# Altium footprint library IFAT6.PcbLib: 65 footprints (part 2 of 5)
Each footprint in its own frame and in the unit in brackets; x right, y up, seen from the top. Pads: shape width x height; smd on the part's side, far side on the other; paste and mask are expansions set on the pad; w line width, h text height; cw(c..) or ccw(c..) is an arc to the next point about the centre after c.
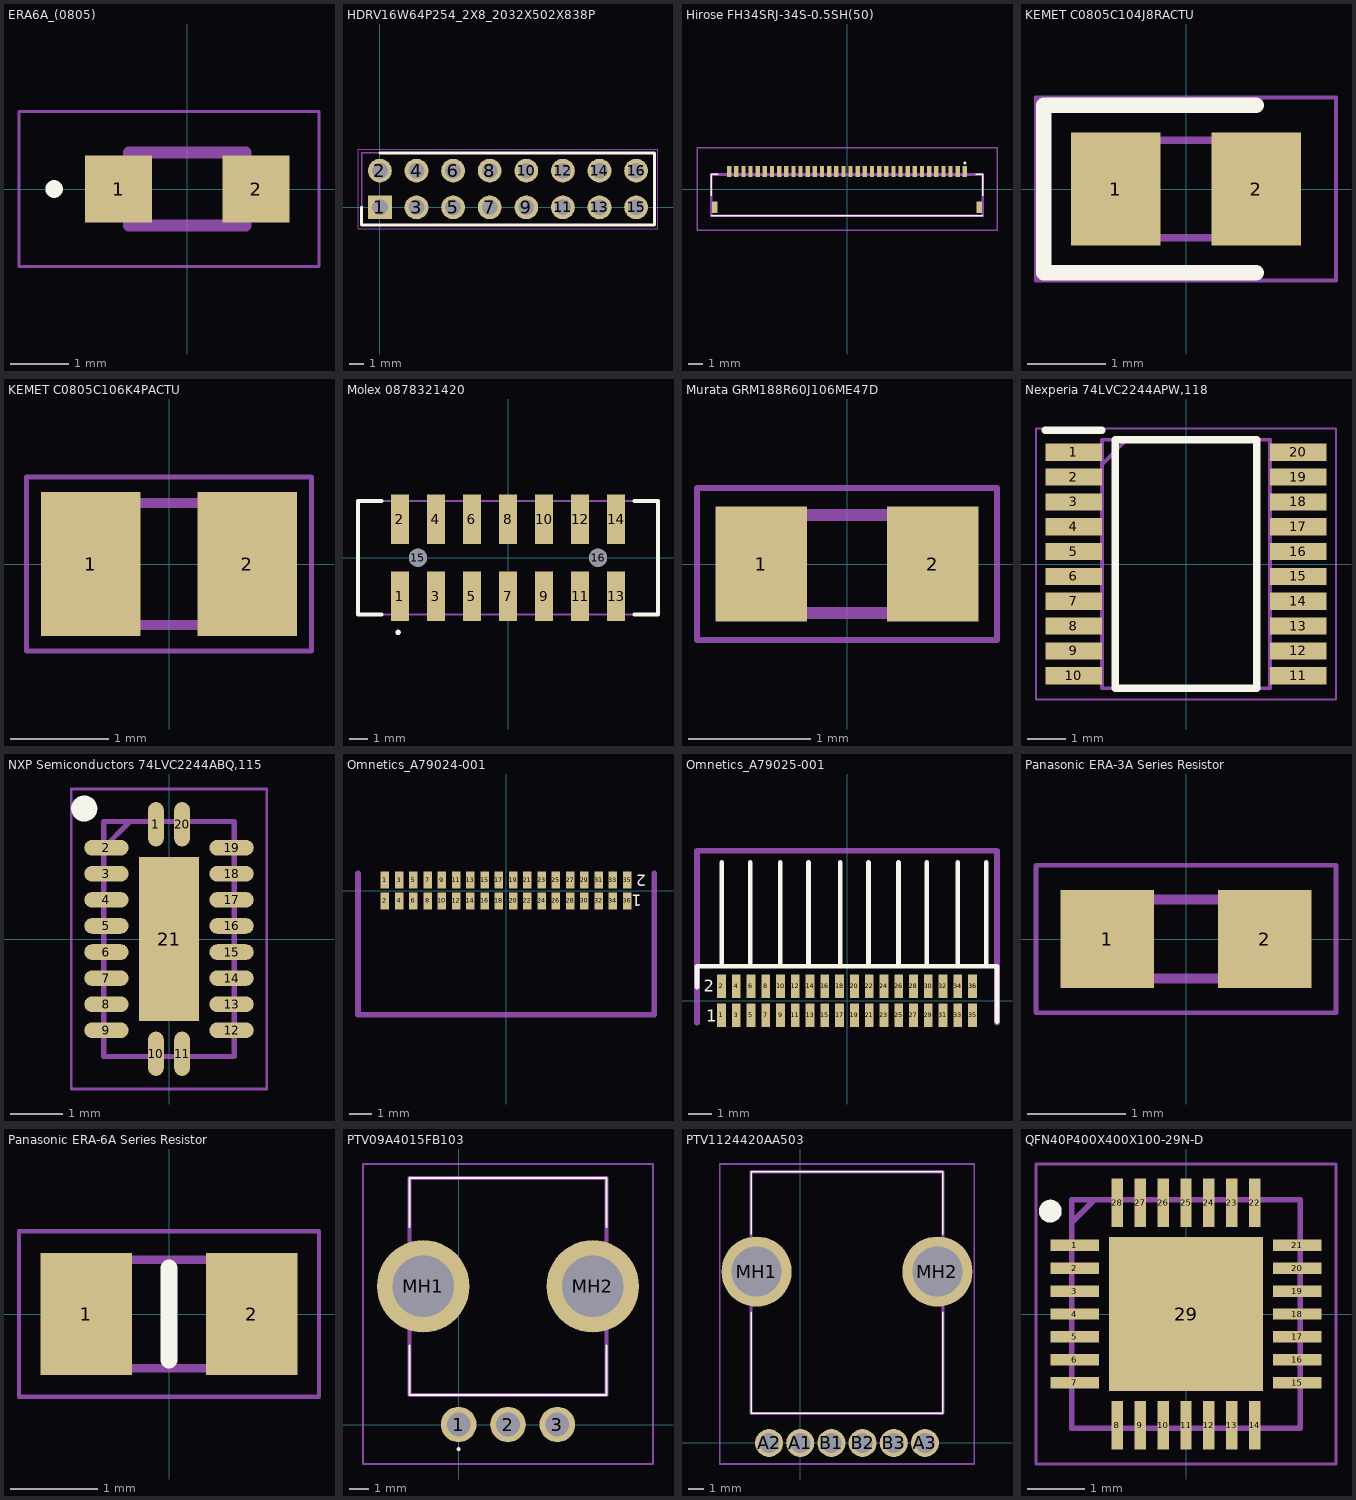
[diagram p1: the footprints below, top view; thin cyan lines are the x and y axes]

## ERA6A_(0805) [mm]
pads (2):
  rect 1.15x1.15 smd: 1(-1.175,0) 2(1.175,0)
Top Overlay:
  circle w0.2: c-2.275,0 r0.05
Mechanical 13:
  lines w0.2: -1,-0.625 -1,0.625 1,0.625 1,-0.625 -1,-0.625
Mechanical 15:
  lines w0.05: -2.875,-1.325 -2.875,1.325 2.25,1.325 2.25,-1.325 -2.875,-1.325
3D body "ERA-6AEB2741V.stp": height 0.5, standoff 0, extent -1,-0.625 1,0.625

## HDRV16W64P254_2X8_2032X502X838P [mm]
pads (16):
  rect 1.65x1.65 hole 1.1: 1(0,0)
  round 1.65 hole 1.1: 2(0,2.54) 3(2.54,0) 4(2.54,2.54) 5(5.08,0) 6(5.08,2.54) 7(7.62,0) 8(7.62,2.54) 9(10.16,0) 10(10.16,2.54) 11(12.7,0) 12(12.7,2.54) 13(15.24,0) 14(15.24,2.54) 15(17.78,0) 16(17.78,2.54)
Top Overlay:
  lines w0.2: -1.27,0 -1.27,-1.24 19.05,-1.24 19.05,3.78 0,3.78
Mechanical 13:
  lines w0.1: -1.27,-1.24 19.05,-1.24 19.05,3.78 -1.27,3.78 -1.27,-1.24
Mechanical 15:
  lines w0.05: -1.52,-1.49 19.3,-1.49 19.3,4.03 -1.52,4.03 -1.52,-1.49
3D body "HTSW-108-07-G-D.stp": height 8.38, standoff -2.54, extent -1.27,-1.24 19.05,3.78

## Hirose FH34SRJ-34S-0.5SH(50) [mm] "CONN FPC/FFC 34POS .5MM"
pads (36):
  rect 0.3x0.8 smd: 1(8.25,1.225) 2(7.75,1.225) 3(7.25,1.225) 4(6.75,1.225) 5(6.25,1.225) 6(5.75,1.225) 7(5.25,1.225) 8(4.75,1.225) 9(4.25,1.225) 10(3.75,1.225) 11(3.25,1.225) 12(2.75,1.225) 13(2.25,1.225) 14(1.75,1.225) 15(1.25,1.225) 16(0.75,1.225) 17(0.25,1.225) 18(-0.25,1.225) 19(-0.75,1.225) 20(-1.25,1.225) 21(-1.75,1.225) 22(-2.25,1.225) 23(-2.75,1.225) 24(-3.25,1.225) 25(-3.75,1.225) 26(-4.25,1.225) 27(-4.75,1.225) 28(-5.25,1.225) 29(-5.75,1.225) 30(-6.25,1.225) 31(-6.75,1.225) 32(-7.25,1.225) 33(-7.75,1.225) 34(-8.25,1.225)
  rect 0.4x0.8 smd: MP1(-9.25,-1.275) MP2(9.25,-1.275)
Top Overlay:
  lines w0.1: -9.5,-1.875 9.5,-1.875 ; -9.5,-0.475 -9.5,1.025 -9,1.025 ; 9,1.025 9.5,1.025 9.5,-0.475 ; 8.2,1.825 ccw(c8.25,1.825) 8.3,1.825 ccw(c8.25,1.825) 8.2,1.825
Mechanical 13:
  lines w0.2: -9.5,-1.875 -9.5,1.025 9.5,1.025 9.5,-1.875 -9.5,-1.875
Mechanical 15:
  lines w0.1: -10.5,-2.875 -10.5,2.875 10.5,2.875 10.5,-2.875 -10.5,-2.875
3D body "FH34SRJ-34S-0.5SH_50_.stp": height 1.1, standoff 0, extent -9.5,-1.875 9.5,1.595

## KEMET C0805C104J8RACTU [mm] "CAP CER 0.1UF 10V X7R 0805"
pads (2):
  rect 1.15x1.45 smd: 1(-0.9,0) 2(0.9,0)
Top Overlay:
  lines w0.2: 0.9,-1.075 -1.825,-1.075 -1.825,1.075 0.9,1.075
Mechanical 13:
  lines w0.1: -1,0.05 -0.425,0.625 ; -1,-0.625 1,-0.625 1,0.625 -1,0.625 -1,-0.625
Mechanical 15:
  lines w0.05: -1.925,-1.175 1.925,-1.175 1.925,1.175 -1.925,1.175 -1.925,-1.175
3D body "C0805C104J8RACTU.stp": height 0.88, standoff 0, extent -1,-0.625 1,0.625

## KEMET C0805C106K4PACTU [mm] "CAP CER 10UF 16V X5R 0805"
pads (2):
  rect 1.02x1.47 smd: 1(-0.8,0) 2(0.8,0)
Mechanical 13:
  lines w0.1: -1,-0.625 1,-0.625 1,0.625 -1,0.625 -1,-0.625
Mechanical 15:
  lines w0.05: -1.46,-0.89 1.46,-0.89 1.46,0.89 -1.46,0.89 -1.46,-0.89
3D body "C0805C106K4PACTU.stp": height 1.45, standoff 0, extent -1.1,-0.44 1.1,0.44

## Molex 0878321420 [mm] "CONN HEADER SMD 14POS 2MM"
pads (16):
  rect 1x2.75 smd: 1(-6,-2.125) 2(-6,2.125) 3(-4,-2.125) 4(-4,2.125) 5(-2,-2.125) 6(-2,2.125) 7(0,-2.125) 8(0,2.125) 9(2,-2.125) 10(2,2.125) 11(4,-2.125) 12(4,2.125) 13(6,-2.125) 14(6,2.125)
  round 1 hole 1 unplated: 15(-5,0) 16(5,0)
Top Overlay:
  circle w0.2: c-6.102,-4.144 r0.05
  lines w0.2: -7,-3.15 -8.325,-3.15 -8.325,3.15 -7,3.15 ; 7,-3.15 8.325,-3.15 8.325,3.15 7,3.15
Mechanical 13:
  lines w0.1: -8.325,-3.15 8.325,-3.15 8.325,3.15 -8.325,3.15 -8.325,-3.15
3D body "878321420.stp": height 7.61, standoff -0.99, extent -8.325,-3.15 8.325,3.15

## Murata GRM188R60J106ME47D [mm] "CAP CER 10UF 6.3V X5R 0603"
pads (2):
  rect 0.75x0.94 smd: 1(-0.7,0) 2(0.7,0)
Mechanical 13:
  lines w0.1: -0.8,-0.4 0.8,-0.4 0.8,0.4 -0.8,0.4 -0.8,-0.4
Mechanical 15:
  lines w0.05: -1.225,-0.62 1.225,-0.62 1.225,0.62 -1.225,0.62 -1.225,-0.62
3D body "GRM188R60J106ME47D.stp": height 0.9, standoff 0, extent -0.8,-0.4 0.8,0.4

## Nexperia 74LVC2244APW,118 [mm] "IC BUFF NON-INVERT 3.6V 20DHVQFN"
pads (20):
  rect 1.475x0.45 smd: 1(-2.938,2.925) 2(-2.938,2.275) 3(-2.938,1.625) 4(-2.938,0.975) 5(-2.938,0.325) 6(-2.938,-0.325) 7(-2.938,-0.975) 8(-2.938,-1.625) 9(-2.938,-2.275) 10(-2.938,-2.925) 11(2.938,-2.925) 12(2.938,-2.275) 13(2.938,-1.625) 14(2.938,-0.975) 15(2.938,-0.325) 16(2.938,0.325) 17(2.938,0.975) 18(2.938,1.625) 19(2.938,2.275) 20(2.938,2.925)
Top Overlay:
  lines w0.2: -3.675,3.5 -2.2,3.5 ; -1.85,-3.25 -1.85,3.25 1.85,3.25 1.85,-3.25 -1.85,-3.25
Mechanical 13:
  lines w0.1: -2.2,2.6 -1.55,3.25 ; -2.2,-3.25 -2.2,3.25 2.2,3.25 2.2,-3.25 -2.2,-3.25
Mechanical 15:
  lines w0.05: -3.925,-3.55 -3.925,3.55 3.925,3.55 3.925,-3.55 -3.925,-3.55
3D body "74LVC2244APW,118.stp": height 1.1, standoff 0, extent -3.2,-3.25 3.2,3.25

## NXP Semiconductors 74LVC2244ABQ,115 [mm] "IC BUFF NON-INVERT 3.6V 20DHVQFN"
pads (21):
  oval 0.3x0.85 smd: 1(-0.25,2.2) 10(-0.25,-2.2) 11(0.25,-2.2) 20(0.25,2.2)
  oval 0.85x0.3 smd: 2(-1.2,1.75) 3(-1.2,1.25) 4(-1.2,0.75) 5(-1.2,0.25) 6(-1.2,-0.25) 7(-1.2,-0.75) 8(-1.2,-1.25) 9(-1.2,-1.75) 12(1.2,-1.75) 13(1.2,-1.25) 14(1.2,-0.75) 15(1.2,-0.25) 16(1.2,0.25) 17(1.2,0.75) 18(1.2,1.25) 19(1.2,1.75)
  rect 1.15x3.15 smd: 21(0,0)
Top Overlay:
  circle w0.25: c-1.625,2.5 r0.125
Mechanical 13:
  lines w0.1: -1.25,1.75 -0.75,2.25 ; -1.25,-2.25 1.25,-2.25 1.25,2.25 -1.25,2.25 -1.25,-2.25
Mechanical 15:
  lines w0.05: -1.875,-2.875 1.875,-2.875 1.875,2.875 -1.875,2.875 -1.875,-2.875
3D body "74LVC2244ABQ,115.stp": height 1, standoff 0, extent -1.3,-2.3 1.3,2.3

## Omnetics_A79024-001 [mm] "36 Position Dual Row Male Nano-Miniature (.025\"/.64mm) Connector"
pads (36):
  rect 0.38x0.76 smd: 1(-5.44,0.47) 2(-5.44,-0.47) 3(-4.8,0.47) 4(-4.8,-0.47) 5(-4.16,0.47) 6(-4.16,-0.47) 7(-3.52,0.47) 8(-3.52,-0.47) 9(-2.88,0.47) 10(-2.88,-0.47) 11(-2.24,0.47) 12(-2.24,-0.47) 13(-1.6,0.47) 14(-1.6,-0.47) 15(-0.96,0.47) 16(-0.96,-0.47) 17(-0.32,0.47) 18(-0.32,-0.47) 19(0.32,0.47) 20(0.32,-0.47) 21(0.96,0.47) 22(0.96,-0.47) 23(1.6,0.47) 24(1.6,-0.47) 25(2.24,0.47) 26(2.24,-0.47) 27(2.88,0.47) 28(2.88,-0.47) 29(3.52,0.47) 30(3.52,-0.47) 31(4.16,0.47) 32(4.16,-0.47) 33(4.8,0.47) 34(4.8,-0.47) 35(5.44,0.47) 36(5.44,-0.47)
Top Overlay:
  text "2" at 6.3,0.7 h0.52
  text "1" at 6.1,-0.2 h0.52
Mechanical 1:
  lines w0.254: -6.65,-5.58 6.65,-5.58 ; -6.65,-5.5 -6.65,0.764 ; 6.65,-5.5 6.65,0.764
3D body "A79024-001.STEP": height 1.8, standoff 0.01, extent -6.54,-5.535 6.541,0.764

## Omnetics_A79025-001 [mm] "36 Position Dual Row Female Nano-Miniature (.025\"/.64mm) Connector"
pads (36):
  rect 0.38x1.02 smd: 1(-5.44,-0.635) 2(-5.44,0.635) 3(-4.8,-0.635) 4(-4.8,0.635) 5(-4.16,-0.635) 6(-4.16,0.635) 7(-3.52,-0.635) 8(-3.52,0.635) 9(-2.88,-0.635) 10(-2.88,0.635) 11(-2.24,-0.635) 12(-2.24,0.635) 13(-1.6,-0.635) 14(-1.6,0.635) 15(-0.96,-0.635) 16(-0.96,0.635) 17(-0.32,-0.635) 18(-0.32,0.635) 19(0.32,-0.635) 20(0.32,0.635) 21(0.96,-0.635) 22(0.96,0.635) 23(1.6,-0.635) 24(1.6,0.635) 25(2.24,-0.635) 26(2.24,0.635) 27(2.88,-0.635) 28(2.88,0.635) 29(3.52,-0.635) 30(3.52,0.635) 31(4.16,-0.635) 32(4.16,0.635) 33(4.8,-0.635) 34(4.8,0.635) 35(5.44,-0.635) 36(5.44,0.635)
Top Overlay:
  lines w0.2: -6.5,0.6 -6.5,1.5 6.5,1.5 6.5,-0.9 ; -5.43,1.5 -5.43,6 ; -4.2,1.5 -4.2,6 ; -2.9,1.5 -2.9,6 ; -1.67,1.5 -1.67,6 ; -0.3,1.5 -0.3,6 ; 0.93,1.5 0.93,6 ; 2.23,1.5 2.23,6 ; 3.46,1.5 3.46,6 ; 4.8,1.5 4.8,6 ; 6.03,1.5 6.03,6
  text "1" at -6.1,-0.9 h0.52
  text "2" at -6.2,0.4 h0.52
Mechanical 1:
  lines w0.254: -6.5,-0.945 -6.5,6.5 6.5,6.5 6.5,-0.945
3D body "A79025-001.STEP": height 1.8, standoff 0.01, extent -6.541,-0.945 6.54,6.497

## Panasonic ERA-3A Series Resistor [mm] "RES SMD 0603"
pads (2):
  rect 0.95x1 smd: 1(-0.8,0) 2(0.8,0)
Mechanical 13:
  lines w0.1: -0.8,-0.4 0.8,-0.4 0.8,0.4 -0.8,0.4 -0.8,-0.4
Mechanical 15:
  lines w0.05: -1.525,-0.75 1.525,-0.75 1.525,0.75 -1.525,0.75 -1.525,-0.75
3D body "ERA-3AEB102V.stp": height 0.55, standoff 0, extent -0.8,-0.4 0.8,0.4

## Panasonic ERA-6A Series Resistor [mm] "RES SMD 0805"
pads (2):
  rect 1.05x1.4 smd: 1(-0.95,0) 2(0.95,0)
Top Overlay:
  lines w0.2: 0,-0.525 0,0.525
Mechanical 13:
  lines w0.1: -1,-0.625 -1,0.625 1,0.625 1,-0.625 -1,-0.625
Mechanical 15:
  lines w0.05: -1.725,-0.95 -1.725,0.95 1.725,0.95 1.725,-0.95 -1.725,-0.95
3D body "ERA-6AEB105V.stp": height 0.6, standoff 0, extent -1,-0.625 1,0.625

## PTV09A4015FB103 [mm]
pads (5):
  round 1.8 hole 1.2: 1(0,0) 2(2.5,0) 3(5,0)
  round 4.686 hole 3.124: MH1(-1.8,7) MH2(6.8,7)
Top Overlay:
  lines w0.1: -2.5,4 -2.5,1.5 7.5,1.5 7.5,4 ; -2.5,10 -2.5,12.5 7.5,12.5 7.5,10 ; 0,-1.3 cw(c0,-1.25) 0,-1.2 cw(c0,-1.25) 0,-1.3
Mechanical 13:
  lines w0.2: -2.5,1.5 -2.5,12.5 7.5,12.5 7.5,1.5 -2.5,1.5
Mechanical 15:
  lines w0.1: -4.843,-2 -4.843,13.2 9.843,13.2 9.843,-2 -4.843,-2
3D body "PTV09A-4025F-B103.stp": height 15.6, standoff -5, extent -3.251,-0.499 8.262,12.5

## PTV1124420AA503 [mm]
pads (8):
  round 1.8 hole 1.3: A1(0,0) A2(-2,0) A3(8,0) B1(2,0) B2(4,0) B3(6,0)
  round 4.5 hole 3.202: MH1(-2.8,11) MH2(8.8,11)
Top Overlay:
  lines w0.1: -3.15,8.4 -3.15,1.9 9.15,1.9 9.15,8.4 ; -3.15,13.4 -3.15,17.4 9.15,17.4 9.15,13.4
Mechanical 13:
  lines w0.2: -3.15,1.9 -3.15,17.4 9.15,17.4 9.15,1.9 -3.15,1.9
Mechanical 15:
  lines w0.1: -5.175,-1.35 -5.175,17.9 11.175,17.9 11.175,-1.35 -5.175,-1.35
3D body "PTV112-4420A-A503.stp": height 20.1, standoff -5, extent -4.289,-0.549 10.301,17.4

## QFN40P400X400X100-29N-D [mm]
pads (29):
  rect 0.85x0.2 smd: 1(-1.95,1.2) 2(-1.95,0.8) 3(-1.95,0.4) 4(-1.95,0) 5(-1.95,-0.4) 6(-1.95,-0.8) 7(-1.95,-1.2) 15(1.95,-1.2) 16(1.95,-0.8) 17(1.95,-0.4) 18(1.95,0) 19(1.95,0.4) 20(1.95,0.8) 21(1.95,1.2)
  rect 0.2x0.85 smd: 8(-1.2,-1.95) 9(-0.8,-1.95) 10(-0.4,-1.95) 11(0,-1.95) 12(0.4,-1.95) 13(0.8,-1.95) 14(1.2,-1.95) 22(1.2,1.95) 23(0.8,1.95) 24(0.4,1.95) 25(0,1.95) 26(-0.4,1.95) 27(-0.8,1.95) 28(-1.2,1.95)
  rect 2.7x2.7 smd: 29(0,0)
Top Overlay:
  circle w0.2: c-2.375,1.8 r0.1
Mechanical 13:
  lines w0.1: -2,1.6 -1.6,2 ; -2,-2 -2,2 2,2 2,-2 -2,-2
Mechanical 15:
  lines w0.05: -2.625,-2.625 -2.625,2.625 2.625,2.625 2.625,-2.625 -2.625,-2.625
3D body "AD5679RBCPZ-1.stp": height 1, standoff 0, extent -2.05,-2.05 2.05,2.05